# Altium footprint library ESP32-SIM800C_KIEN.PcbLib: 45 footprints (part 1 of 3)
Each footprint in its own frame and in the unit in brackets; x right, y up, seen from the top. Pads: shape width x height; smd on the part's side, far side on the other; paste and mask are expansions set on the pad; w line width, h text height; cw(c..) or ccw(c..) is an arc to the next point about the centre after c.
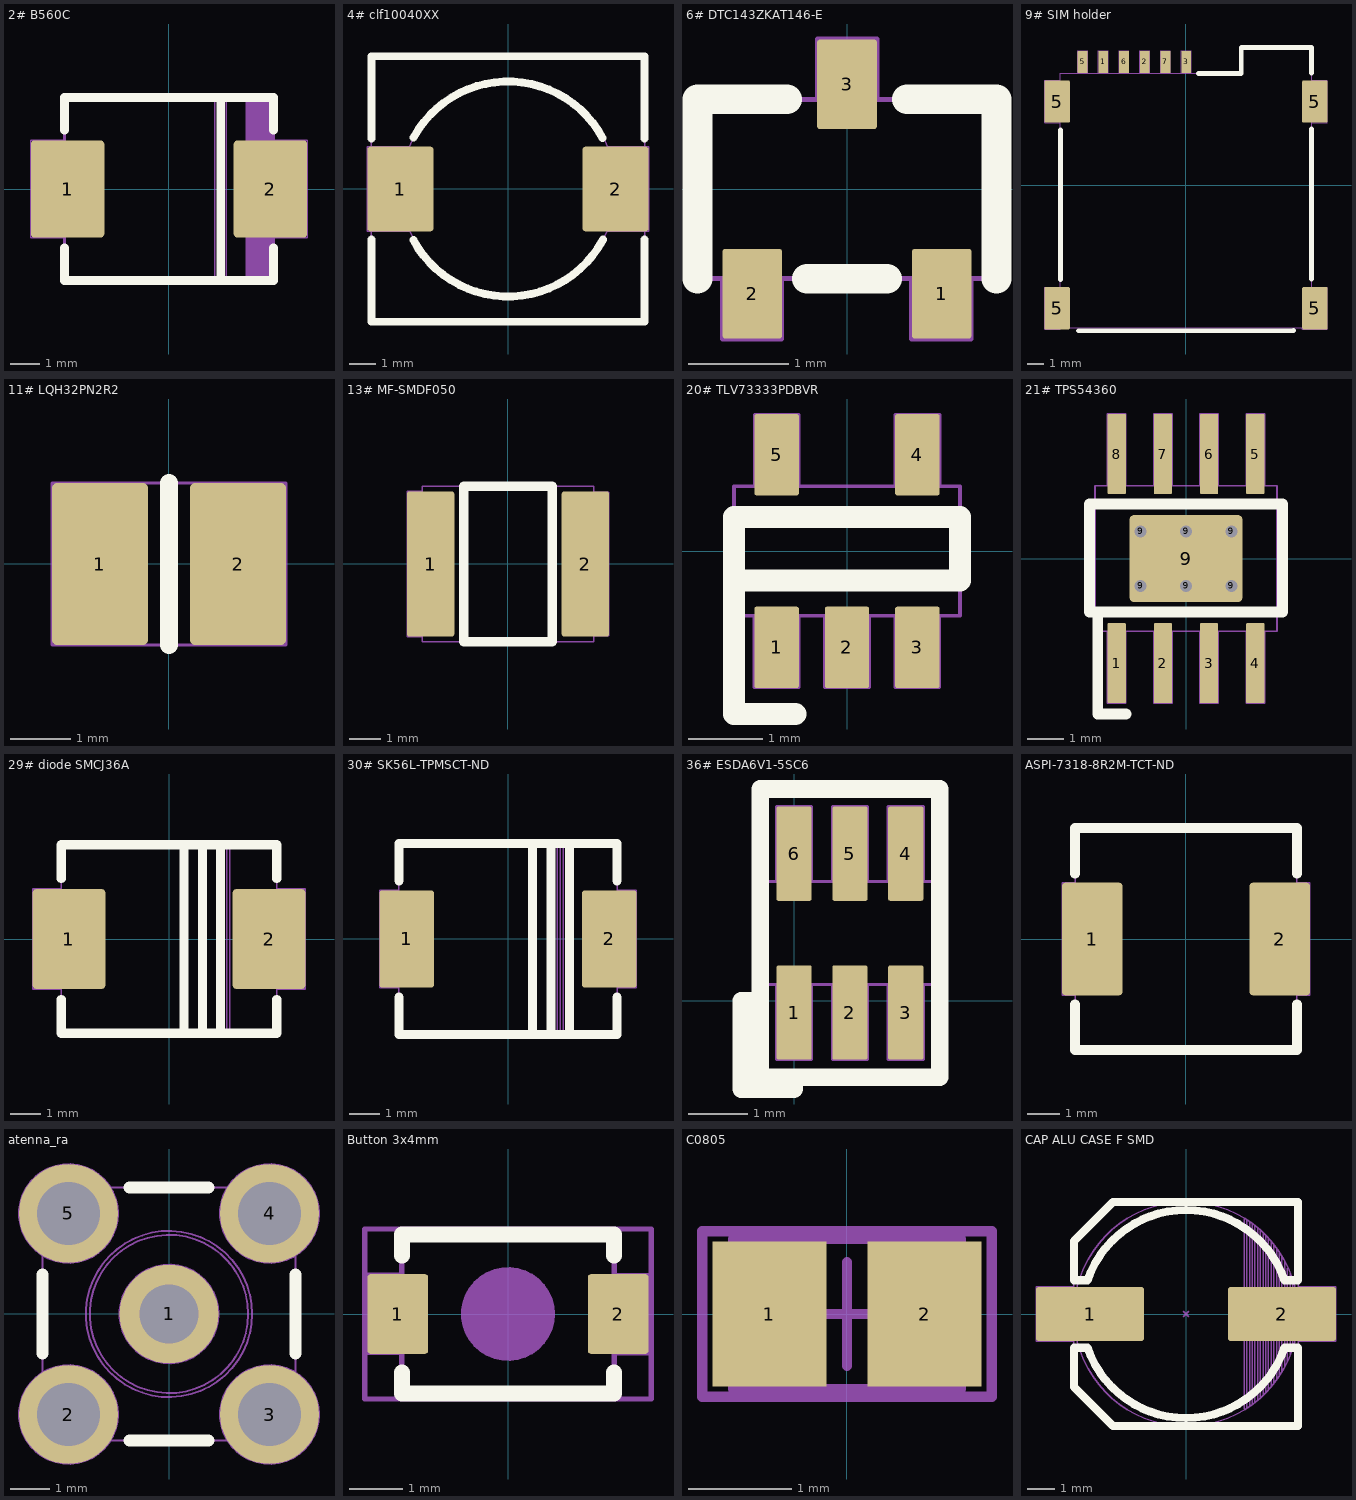
[diagram p0: the footprints below, top view; thin cyan lines are the x and y axes]

## 2# B560C [mm] "Molded Diode, 2-Leads, Body 6.85x5.90mm, IPC Medium Density"
height 2.5
pads (2):
  rrect10% 2.5x3.3 smd mask+0.05: 1(-3.45,0) 2(3.45,0)
Top Overlay:
  lines w0.3: -3.555,-2 -3.555,-3.11 3.555,-3.11 3.555,-2 ; -3.555,2 -3.555,3.11 3.555,3.11 3.555,2 ; 1.76,-2.99 1.76,3.01
Mechanical 2:
  lines w0.05: -3.555,1.65 -4.7,1.65 -4.7,-1.65 -3.55,-1.65 ; 1.55,-3.11 1.55,3.11 ; 1.75,-3.11 1.75,3.11 ; 1.95,-3.11 1.95,3.11 ; 3.555,-1.65 4.7,-1.65 4.7,1.65 3.555,1.65 ; -3.555,-3.11 -3.555,3.11 3.555,3.11 3.555,-3.11 -3.555,-3.11
  text "A" at -4.52,-0.58 h0.75
  text "K" at 3.82,-0.53 h0.75
Mechanical 13:
  rectangle: 2.598,-3.11 3.555,3.11
  lines w0.1: -3.555,-3.11 -3.555,3.11 3.555,3.11 3.555,-3.11 -3.555,-3.11
3D body "B560C.step": height 2.5, standoff 0, extent -3.775,-3.11 3.775,3.11

## 4# clf10040XX [mm] "Precision Wire Wound Inductor, 2-Leads, Body 10.00x9.70mm, IPC Medium Density"
height 4.1
pads (2):
  rrect10% 2.5x3.2 smd mask+0.05: 1(-4.05,0) 2(4.05,0)
Top Overlay:
  lines w0.3: -5.15,-1.9 -5.15,-5 5.15,-5 5.15,-1.9 ; -5.15,1.9 -5.15,5 5.15,5 5.15,1.9 ; -3.567,-1.917 ccw(c0,0) 3.571,-1.911 ; -3.552,1.946 cw(c0,0) 3.566,1.92
Mechanical 2:
  lines w0.05: -5.15,-1.6 -5.15,-5 5.15,-5 5.15,-1.6 ; -5.15,1.6 -5.15,5 5.15,5 5.15,1.6 ; -3.72,1.6 -5.3,1.6 -5.3,-1.6 -3.717,-1.6 ; 3.717,-1.6 5.3,-1.6 5.3,1.6 3.72,1.6 ; -3.697,-1.577 ccw(c0.02,0.03) 3.737,-1.577 ccw(c0.02,0.03) -3.697,-1.577
3D body "clf10040.step": height 4.1, standoff -0.1, extent -5,-4.85 5.2,4.85

## 6# DTC143ZKAT146-E [mm] "SOT-346 SMT3"
height 1
pads (3):
  rrect10% 0.6x0.9 smd mask+0.05: 1(0.95,-1.05) 2(-0.95,-1.05) 3(0,1.05)
Top Overlay:
  lines w0.3: -1.5,-0.9 -1.5,0.9 -0.6,0.9 ; -0.4,-0.9 0.4,-0.9 ; 0.6,0.9 1.5,0.9 1.5,-0.9
Mechanical 2:
  lines w0.05: -1.251,-0.9 -1.251,-1.504 -0.656,-1.504 -0.656,-0.899 ; -0.294,0.899 -0.294,1.504 0.301,1.504 0.301,0.9 ; 0.649,-0.9 0.649,-1.504 1.244,-1.504 1.244,-0.899 ; -1.5,-0.9 -1.5,0.9 1.5,0.9 1.5,-0.9 -1.5,-0.9
  text "C" at -0.15,0.4 h0.75
  text "B" at 0.9,-0.8 h0.75
  text "E" at -1.1,-0.7 h0.75
3D body "User Library-User Library-SOT-346T.STEP": height 1.2, standoff 0, extent -1.45,-1.4 1.45,1.4

## 9# SIM holder [mm] "Micro SIM Push Connector SIM Card Connector with 6 Pin 1.35H"
height 1.35
pads (10):
  rrect10% 0.6x1.35 smd mask+0.05: 1(-5.07,7.553) 2(-2.53,7.553) 3(0.01,7.553) 5(-6.34,7.553) 6(-3.8,7.553) 7(-1.26,7.553)
  rrect10% 1.55x2.6 smd mask+0.05: 5(-7.9,-7.553) 5(-7.9,5.127) 5(7.9,-7.553) 5(7.9,5.127)
Top Overlay:
  lines w0.3: -7.7,-5.79 -7.7,3.4 ; -6.594,-8.934 6.596,-8.924 ; 0.75,6.85 3.39,6.85 3.39,8.45 7.7,8.45 7.7,6.87 ; 7.7,-5.76 7.7,3.45
Mechanical 2:
  lines w0.05: -7.7,-8.852 -8.675,-8.852 ; -7.7,-8.847 -7.7,-8.74 ; -7.7,-6.252 -8.675,-6.252 ; -7.7,3.828 -8.675,3.828 -8.675,6.428 -7.7,6.428 ; -5.37,6.86 -5.37,8.228 -4.77,8.228 -4.77,6.86 ; -4.1,6.86 -4.1,8.228 -3.5,8.228 -3.5,6.86 ; -2.83,6.86 -2.83,8.228 -2.23,8.228 -2.23,6.86 ; -1.56,6.86 -1.56,8.228 -0.96,8.228 -0.96,6.86 ; -0.29,6.86 -0.29,8.228 0.31,8.228 0.31,6.86 ; 7.125,-8.74 7.125,-8.852 8.675,-8.852 8.675,-6.252 7.7,-6.252 ; 7.7,3.828 8.675,3.828 8.675,6.428 7.7,6.428 ; -8.675,-8.852 -8.675,-6.252 ; -8.675,-8.852 -8.675,-6.252 ; -8.675,-8.852 -8.675,-6.252 ; -7.7,-8.74 -7.7,6.86 3.39,6.86 3.39,8.46 7.7,8.46 7.7,-8.74 -7.7,-8.74 ; -6.64,6.86 -6.04,6.86 ; -6.64,6.86 -6.64,8.228 ; -6.64,6.86 -6.64,8.228 ; -6.64,8.228 -6.04,8.228 ; -6.64,8.228 -6.04,8.228 ; -6.04,6.86 -6.04,8.228 ; -6.04,6.86 -6.04,8.228
  text "1" at -5.13,7.33 h0.75
  text "6" at -3.91,7.332 h0.75
  text "2" at -2.619,7.333 h0.75
  text "7" at -1.32,7.33 h0.75
  text "3" at -0.075,7.332 h0.75
  text "5" at -6.44,7.337 h0.75
  text "GND" at -8.063,4.742 h0.75
  text "GND" at -8.063,-7.86 h0.75
  text "GND" at 8.371,-7.86 h0.75
  text "GND" at 8.371,4.742 h0.75
3D body "User Library-Sim Holder.step": height 1.35, standoff 0, extent -8.2,-8.9 8.2,8.3

## 11# LQH32PN2R2 [mm] "NN0"
height 1.7
pads (2):
  rrect10% 1.6x2.7 smd mask+0.05: 1(-1.15,0) 2(1.15,0)
Top Overlay:
  lines w0.3: 0,-1.35 0,1.35
Mechanical 2:
  lines w0.05: -1.45,-1.35 -1.949,-1.35 -1.949,1.35 -1.45,1.35 ; -1.45,-1.35 1.45,-1.35 ; -1.45,-1.35 -1.45,1.35 ; -1.45,1.35 1.45,1.35 ; 1.45,-1.35 1.949,-1.35 1.949,1.35 1.45,1.35 ; 1.45,-1.35 1.45,1.35
3D body "User Library-LQH32PN_sw.step": height 1.5, standoff -0.05, extent -1.663,-1.225 1.537,1.275

## 13# MF-SMDF050 [mm] "style1"
height 1.09
pads (2):
  rrect10% 1.5x4.6 smd mask+0.05: 1(-2.45,0) 2(2.45,0)
Top Overlay:
  lines w0.3: -1.397,-2.465 1.397,-2.465 1.397,2.465 -1.397,2.465 -1.397,-2.465
Mechanical 2:
  lines w0.05: 2.72,-2.275 3.187,-2.275 3.187,2.275 ; 2.72,2.275 2.825,2.275 3.059,2.275 3.176,2.275 ; -3.188,-2.3 -3.188,2.3 ; -3.188,-2.3 -2.72,-2.3 -3.188,-2.3 ; -3.188,-2.3 -3.188,2.3 ; -3.188,2.3 -2.72,2.3 -3.188,2.3 ; -2.72,-2.465 -2.72,2.465 2.72,2.465 2.72,-2.465 -2.72,-2.465
3D body "User Library-MF-SMDF050.step": height 1.05, standoff -0.05, extent -2.7,-2.475 2.7,2.425

## 20# TLV73333PDBVR [mm] "IC REG LINEAR 3.3V 300MA SOT23-5"
height 0.8
pads (5):
  rrect10% 0.6x1.1 smd mask+0.05: 1(-0.95,-1.3) 2(0,-1.3) 3(0.95,-1.3) 4(0.95,1.3) 5(-0.95,1.3)
Top Overlay:
  lines w0.3: -0.7,-2.2 -1.525,-2.2 -1.525,-0.398 ; -1.525,-0.398 1.525,-0.398 1.525,0.459 -1.525,0.459 -1.525,-0.398
Mechanical 2:
  lines w0.05: -1.249,-0.878 -1.249,-1.839 -0.654,-1.839 -0.654,-0.875 ; -1.246,0.875 -1.246,1.839 -0.651,1.839 -0.651,0.878 ; -0.299,-0.878 -0.299,-1.839 0.296,-1.839 0.296,-0.875 ; 0.651,-0.878 0.651,-1.839 1.246,-1.839 1.246,-0.875 ; 0.654,0.875 0.654,1.839 1.249,1.839 1.249,0.878 ; -1.525,-0.875 -1.525,0.875 1.525,0.875 1.525,-0.875 -1.525,-0.875
  text "1" at -1.055,-0.75 h0.75
  text "3" at 0.846,-0.745 h0.75
  text "4" at 0.817,0.374 h0.75
  text "5" at -1.074,0.336 h0.75
3D body "CircuitWorks-SOT-23-5.step": height 0.95, standoff -0.15, extent -1.5,-1.25 1.5,1.25

## 21# TPS54360 [mm] "R-PDSO-G8,V Input, 3.5-A, Step-Down DC/DC Converter"
height 1.7
pads (15):
  rrect10% 0.5x2.2 smd mask+0.05: 1(-1.905,-2.875) 2(-0.635,-2.875) 3(0.635,-2.875) 4(1.905,-2.875) 5(1.905,2.875) 6(0.635,2.875) 7(-0.635,2.875) 8(-1.905,2.875)
  round 0.33 hole 0.33 mask+0.05: 9(-1.25,-0.75) 9(-1.25,0.75) 9(0,-0.75) 9(0,0.75) 9(1.25,-0.75) 9(1.25,0.75)
  rrect10% 3.1x2.4 smd mask+0.05: 9(0,0)
Top Overlay:
  lines w0: -2.427,-2 -2.427,-1.485
  lines w0.3: -2.427,-1.485 -2.427,-4.273 -1.649,-4.273 ; -2.65,-1.469 -2.65,1.498 2.65,1.498 2.65,-1.469 -2.65,-1.469
Top Solder:
  rectangle: -2.451,-1.475 2.449,1.475
Mechanical 2:
  lines w0.05: -2.155,2 -2.155,3.975 -1.655,3.975 -1.655,2 ; -0.885,-2 -0.885,-3.975 -0.385,-3.975 -0.385,-2 ; -0.885,2 -0.885,3.975 -0.385,3.975 -0.385,2 ; 0.385,-2 0.385,-3.975 0.885,-3.975 0.885,-2 ; 0.385,2 0.385,3.975 0.885,3.975 0.885,2 ; 1.655,-2 1.655,-3.975 2.155,-3.975 2.155,-2 ; 1.655,2 1.655,3.975 2.155,3.975 2.155,2 ; -2.5,-2 2.5,-2 2.5,2 -2.5,2 -2.5,-2 ; -2.155,-3.975 -2.155,-2 -1.655,-2 -1.655,-3.975 -2.155,-3.975
  text "8" at 1.655,-1 h0.75
  text "5" at 1.596,0.803 h0.75
  text "4" at 1.596,-1.515 h0.75
  text "1" at -2.089,-1.515 h0.75
3D body "User Library-TPS54360DDA.step": height 1.53, standoff -0.06, extent -2.5,-3.1 2.5,3.1

## 29# diode SMCJ36A [mm] "DO-214AB (SMC J-Bend)"
height 2.62
pads (2):
  rrect10% 2.4x3.3 smd mask+0.05: 1(-3.3,0) 2(3.3,0)
Top Overlay:
  lines w0.3: -3.555,-2 -3.555,-3.11 3.555,-3.11 3.555,-2 ; -3.555,2 -3.555,3.11 3.555,3.11 3.555,2 ; 0.5,-3.1 0.5,3.11 ; 1.1,-3.1 1.1,3.11 ; 1.7,-3.1 1.7,3.11
Mechanical 2:
  lines w0.05: -3.555,-1.65 -4.5,-1.65 -4.5,1.65 -3.555,1.65 ; 1.8,-3.1 1.8,3.11 ; 1.9,-3.1 1.9,3.11 ; 2,-3.1 2,3.11 ; 3.555,-1.65 4.5,-1.65 4.5,1.65 3.555,1.65 ; -3.555,-3.11 -3.555,3.11 ; -3.555,-3.11 3.555,-3.11 ; -3.555,-3.11 -3.555,3.11 ; -3.555,-3.11 3.555,-3.11 ; -3.555,3.11 3.555,3.11 ; -3.555,3.11 3.555,3.11 ; 3.555,-3.11 3.555,3.11 ; 3.555,-3.11 3.555,3.11 ; 1.7,-3.1 1.7,3.11 1.7,-3.1
  text "K" at 2.4,-0.5 h0.75
  text "A" at -3.2,-0.5 h0.75
3D body "User Library-DO-214AB.step": height 2.93, standoff -0.08, extent -3.975,-3.125 4.175,3.124

## 30# SK56L-TPMSCT-ND [mil] "SK56L-TPMSCT-ND(DO-214AB)"
height 103.15
pads (2):
  rrect10% 70x125 smd mask+1.97: 1(-130,0) 2(130,0)
Top Overlay:
  lines w11.81: -139.96,-74.8 -139.96,-122.44 139.96,-122.44 139.96,-74.8 ; -139.96,74.8 -139.96,122.44 139.96,122.44 139.96,74.8 ; 31.5,122.44 31.5,-122.44 39.37,-122.44 ; 55.12,-122.44 55.12,122.44 ; 78.74,-122.44 78.74,122.44
Mechanical 2:
  lines w1.97: -140.28,62.4 -164.8,62.4 -164.8,-62.24 -140.04,-62.24 ; 59.05,-122.44 59.05,122.44 ; 62.99,-122.44 62.99,122.44 ; 66.93,-122.44 66.93,122.44 ; 70.87,-122.44 70.87,122.44 ; 140.04,62.24 164.8,62.24 164.8,-62.4 140.28,-62.4 ; -139.96,-122.44 -139.96,122.44 139.96,122.44 139.96,-122.44 -139.96,-122.44
  text "K" at 98.43,-27.56 h29.53
  text "A" at -122.05,-27.56 h29.53
3D body "User Library-DO-214AB SMC.step": height 86.71, standoff -3.94, extent -156.49,-116.14 156.5,116.14

## 36# ESDA6V1-5SC6 [mm] "SOT23-6L"
height 1.45
pads (6):
  rrect10% 0.6x1.6 smd mask+0.05: 1(0,-0.2) 2(0.95,-0.2) 3(1.9,-0.2) 4(1.9,2.5) 5(0.95,2.5) 6(0,2.5)
Top Overlay:
  lines w0.3: -0.75,0 -0.75,-1.5 0,-1.5 ; -0.6,0 -0.9,0 -0.9,-1.5 0,-1.5 ; 0,-1.5 0,-1.3 0,-1.5 ; -0.575,-1.3 2.475,-1.3 2.475,3.6 -0.575,3.6 -0.575,-1.3
Mechanical 2:
  lines w0.05: -0.3,2.025 -0.3,3.3 0.3,3.3 0.3,2.025 ; 0.65,0.275 0.65,-1 1.25,-1 1.25,0.275 ; 0.65,2.025 0.65,3.3 1.25,3.3 1.25,2.025 ; 1.6,0.275 1.6,-1 2.2,-1 2.2,0.275 ; 1.6,2.025 1.6,3.3 2.2,3.3 2.2,2.025 ; -0.575,0.275 -0.575,2.025 2.475,2.025 2.475,0.275 -0.575,0.275 ; -0.3,-1 -0.3,0.275 0.3,0.275 0.3,-1 -0.3,-1
  text "1" at -0.065,0.5 h0.75
  text "3" at 1.806,0.438 h0.75
  text "4" at 1.806,1.535 h0.75
  text "6" at -0.141,1.514 h0.75
3D body "User Library-SOT-23-6.step": height 1.09, standoff 0, extent -0.457,-0.024 2.337,2.402

## ASPI-7318-8R2M-TCT-ND [mm] "8.2µH Shielded Wirewound Inductor 4A 68 mOhm Max Nonstandard"
height 3
pads (2):
  rrect10% 1.85x3.45 smd mask+0.05: 1(-2.875,0) 2(2.875,0)
Top Overlay:
  lines w0.3: -3.4,-2 -3.4,-3.4 3.4,-3.4 3.4,-2 ; -3.4,2 -3.4,3.4 3.4,3.4 3.4,2
Mechanical 2:
  lines w0.05: -3.404,1.723 -3.41,1.723 -3.796,1.723 -3.796,-1.727 -3.402,-1.727 -3.402,-1.723 ; 3.402,-1.723 3.402,-1.727 3.794,-1.727 3.794,1.723 3.41,1.723 3.404,1.723 ; -3.4,-3.4 -3.4,3.4 3.4,3.4 3.4,-3.4 -3.4,-3.4
3D body: height 2.54, standoff 0, extent -3.402,-3.4 3.402,3.4
3D body: height 3, standoff 0, extent -3.4,-3.4 3.4,3.4
3D body: height 0.5, standoff 0, extent -3.654,-1.273 -2.468,1.26
3D body: height 0.5, standoff 0, extent 2.467,-1.26 3.653,1.272

## atenna_ra [mm]
pads (5):
  round 2.5 hole 1.5 mask+0.05: 1(0,0)
  round 2.5 hole 1.6 mask+0.05: 2(-2.54,-2.54) 3(2.54,-2.54) 4(2.54,2.54) 5(-2.54,2.54)
Bottom Layer:
  lines w0.254: 0,0 0,-0.25 ; 0,-0.25 0,-0.25
Top Overlay:
  lines w0.3: -3.2,-1 -3.2,1 ; -1,-3.2 1,-3.2 ; -1,3.2 1,3.2 ; 3.2,-1 3.2,1
Mechanical 2:
  circle w0.05: c0,0 r2
  circle w0.05: c0,0 r2.1
  circle w0.05: c0,0 r1.25
  circle w0.05: c0,0 r0.5
  circle w0.05: c2.54,2.54 r1.25
  circle w0.05: c2.54,-2.54 r1.25
  circle w0.05: c-2.54,2.54 r1.25
  circle w0.05: c-2.54,-2.54 r1.25
  lines w0.05: -3.2,-3.2 3.2,-3.2 3.2,3.2 -3.2,3.2 -3.2,-3.2
3D body "User Library-5-1814400-1 sma right angle pcb socket.step": height 10.5, standoff -3.03, extent -3.175,-3.15 3.175,11.05

## Button 3x4mm [mm] "SMD 3x4mm"
pads (2):
  rrect10% 1.143x1.5 smd mask+0.05: 1(-2.075,0) 2(2.075,0)
Top Overlay:
  lines w0.3: -2,-1.1 -2,-1.5 2,-1.5 2,-1.1 ; -2,1.1 -2,1.5 2,1.5 2,1.1
Mechanical 2:
  circle w0.05: c0,0 r0.861
  region: -0.085,-0.861 -0.251,-0.828 -0.408,-0.763 -0.549,-0.669 -0.669,-0.549 -0.763,-0.408 -0.828,-0.251 -0.861,-0.085 -0.861,0 -0.861,0.085 -0.828,0.251 -0.763,0.408 -0.669,0.549 -0.549,0.669 -0.408,0.763 -0.251,0.828 -0.085,0.861 0,0.861 0.085,0.861 0.251,0.828 0.408,0.763 0.549,0.669 0.669,0.549 0.763,0.408 0.828,0.251 0.861,0.085 0.861,-0.085 0.828,-0.251 0.763,-0.408 0.669,-0.549 0.549,-0.669 0.408,-0.763 0.251,-0.828 0.085,-0.861
  lines w0.05: -2.007,0.752 -2.64,0.752 -2.64,-0.744 -2,-0.744 ; 2,0.744 2.64,0.744 2.64,-0.752 2.007,-0.752 ; -2,-1.5 2,-1.5 2,1.5 -2,1.5 -2,-1.5
  text ".Designator" at -0.1,1.1 h0.75
Mechanical 13:
  lines w0.1: -2,-1.5 -2,1.5 2,1.5 2,-1.5 -2,-1.5
Mechanical 15:
  lines w0.1: -0.5,0 0.5,0 ; 0,-0.5 0,0.5 ; -2.7,-1.6 -2.7,1.6 2.7,1.6 2.7,-1.6 -2.7,-1.6
3D body "SMT Tactile Switch PTS-820.STEP": height 2.05, standoff -0.5, extent -2.25,-1.55 2.25,1.55

## C0805 [mm] "Chip Capacitor, Body 2.0x1.3mm, IPC High Density"
height 1.4
pads (2):
  rect 1.1x1.4 smd mask+0.05: 1(-0.75,0) 2(0.75,0)
Mechanical 13:
  lines w0.1: -1.1,-0.725 -1.1,0.725 1.1,0.725 1.1,-0.725 -1.1,-0.725
Mechanical 15:
  lines w0.1: -0.5,0 0.5,0 ; 0,-0.5 0,0.5 ; -1.4,-0.8 -1.4,0.8 1.4,0.8 1.4,-0.8 -1.4,-0.8
3D body: height 1.4, standoff 0, extent -1.1,-0.725 1.1,0.725

## CAP ALU CASE F SMD [mm]
pads (2):
  rrect10% 4x2 smd mask+0.05: 1(-3.55,0) 2(3.55,0)
Top Overlay:
  lines w0.3: -3.645,-1.25 -4.15,-1.25 -4.15,-2.7 -2.7,-4.15 4.15,-4.15 4.15,-1.25 3.645,-1.25 ; -3.645,1.25 -4.15,1.25 -4.15,2.7 -2.7,4.15 4.15,4.15 4.15,1.25 3.645,1.25 ; -3.642,-1.247 ccw(c0,0) 3.642,-1.247 ; -3.642,1.247 cw(c0,0) 3.642,1.247
Mechanical 2:
  circle w0.05: c0,0 r4.15
  lines w0.05: -4.15,-1 -5.55,-1 -5.55,1 -4.15,1 ; -0.1,-0.1 0.1,0.1 ; -0.1,0.1 0.1,-0.1 ; 2.15,-3.5 2.15,3.55 ; 2.25,-3.45 2.25,3.45 ; 2.35,-3.4 2.35,3.4 ; 2.45,-3.35 2.45,3.35 ; 2.55,-3.25 2.55,3.25 ; 2.65,-3.15 2.65,3.15 ; 2.75,-3.1 2.75,3.1 ; 2.85,-3 2.85,3 ; 2.95,-2.9 2.95,2.9 ; 3.05,-2.8 3.05,2.8 ; 3.15,-2.65 3.15,2.65 ; 3.25,-2.55 3.25,2.55 ; 3.35,-2.4 3.35,2.4 ; 3.45,-2.25 3.45,2.25 ; 3.55,-2.1 3.55,2.1 ; 3.65,-1.95 3.65,1.95 ; 3.75,-1.75 3.75,1.7 ; 3.85,-1.5 3.85,1.5 ; 3.95,-1.2 3.95,1.2 ; 4.05,-0.8 4.05,0.85 ; 4.15,-1 5.55,-1 5.55,1 4.15,1 ; -4.15,-2.7 -2.7,-4.15 4.15,-4.15 4.15,4.15 -2.7,4.15 -4.15,2.7 -4.15,-2.7
  text ".Designator" at 0,0 h0.75
3D body "User Library-ALU-F.STEP": height 10.2, standoff 0, extent -4.95,-4.15 4.95,4.15